# Altium footprint library GVI_Z7_Carrier.PcbLib: 1 footprints
Each footprint in its own frame and in the unit in brackets; x right, y up, seen from the top. Pads: shape width x height; smd on the part's side, far side on the other; paste and mask are expansions set on the pad; w line width, h text height; cw(c..) or ccw(c..) is an arc to the next point about the centre after c.
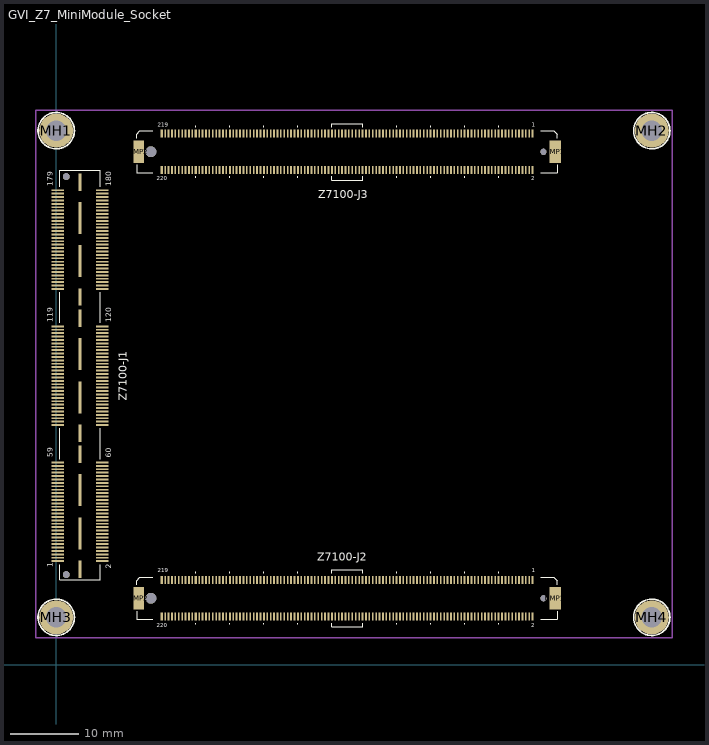
[diagram p0: the footprint, top view; thin cyan lines are the x and y axes]

## GVI_Z7_MiniModule_Socket [mm]
pads (646):
  rect 1.85x0.279 smd: 1(0.22,15.25) 2(6.78,15.25) 3(0.22,15.75) 4(6.78,15.75) 5(0.22,16.25) 6(6.78,16.25) 7(0.22,16.75) 8(6.78,16.75) 9(0.22,17.25) 10(6.78,17.25) 11(0.22,17.75) 12(6.78,17.75) 13(0.22,18.25) 14(6.78,18.25) 15(0.22,18.75) 16(6.78,18.75) 17(0.22,19.25) 18(6.78,19.25) 19(0.22,19.75) 20(6.78,19.75) 21(0.22,20.25) 22(6.78,20.25) 23(0.22,20.75) 24(6.78,20.75) 25(0.22,21.25) 26(6.78,21.25) 27(0.22,21.75) 28(6.78,21.75) 29(0.22,22.25) 30(6.78,22.25) 31(0.22,22.75) 32(6.78,22.75) 33(0.22,23.25) 34(6.78,23.25) 35(0.22,23.75) 36(6.78,23.75) 37(0.22,24.25) 38(6.78,24.25) 39(0.22,24.75) 40(6.78,24.75) 41(0.22,25.25) 42(6.78,25.25) 43(0.22,25.75) 44(6.78,25.75) 45(0.22,26.25) 46(6.78,26.25) 47(0.22,26.75) 48(6.78,26.75) 49(0.22,27.25) 50(6.78,27.25) 51(0.22,27.75) 52(6.78,27.75) 53(0.22,28.25) 54(6.78,28.25) 55(0.22,28.75) 56(6.78,28.75) 57(0.22,29.25) 58(6.78,29.25) 59(0.22,29.75) 60(6.78,29.75) 61(0.22,35.25) 62(6.78,35.25) 63(0.22,35.75) 64(6.78,35.75) 65(0.22,36.25) 66(6.78,36.25) 67(0.22,36.75) 68(6.78,36.75) 69(0.22,37.25) 70(6.78,37.25) 71(0.22,37.75) 72(6.78,37.75) 73(0.22,38.25) 74(6.78,38.25) 75(0.22,38.75) 76(6.78,38.75) 77(0.22,39.25) 78(6.78,39.25) 79(0.22,39.75) 80(6.78,39.75) 81(0.22,40.25) 82(6.78,40.25) 83(0.22,40.75) 84(6.78,40.75) 85(0.22,41.25) 86(6.78,41.25) 87(0.22,41.75) 88(6.78,41.75) 89(0.22,42.25) 90(6.78,42.25) 91(0.22,42.75) 92(6.78,42.75) 93(0.22,43.25) 94(6.78,43.25) 95(0.22,43.75) 96(6.78,43.75) 97(0.22,44.25) 98(6.78,44.25) 99(0.22,44.75) 100(6.78,44.75) 101(0.22,45.25) 102(6.78,45.25) 103(0.22,45.75) 104(6.78,45.75) 105(0.22,46.25) 106(6.78,46.25) 107(0.22,46.75) 108(6.78,46.75) 109(0.22,47.25) 110(6.78,47.25) 111(0.22,47.75) 112(6.78,47.75) 113(0.22,48.25) 114(6.78,48.25) 115(0.22,48.75) 116(6.78,48.75) 117(0.22,49.25) 118(6.78,49.25) 119(0.22,49.75) 120(6.78,49.75) 121(0.22,55.25) 122(6.78,55.25) 123(0.22,55.75) 124(6.78,55.75) 125(0.22,56.25) 126(6.78,56.25) 127(0.22,56.75) 128(6.78,56.75) 129(0.22,57.25) 130(6.78,57.25) 131(0.22,57.75) 132(6.78,57.75) 133(0.22,58.25) 134(6.78,58.25) 135(0.22,58.75) 136(6.78,58.75) 137(0.22,59.25) 138(6.78,59.25) 139(0.22,59.75) 140(6.78,59.75) 141(0.22,60.25) 142(6.78,60.25) 143(0.22,60.75) 144(6.78,60.75) 145(0.22,61.25) 146(6.78,61.25) 147(0.22,61.75) 148(6.78,61.75) 149(0.22,62.25) 150(6.78,62.25) 151(0.22,62.75) 152(6.78,62.75) 153(0.22,63.25) 154(6.78,63.25) 155(0.22,63.75) 156(6.78,63.75) 157(0.22,64.25) 158(6.78,64.25) 159(0.22,64.75) 160(6.78,64.75) 161(0.22,65.25) 162(6.78,65.25) 163(0.22,65.75) 164(6.78,65.75) 165(0.22,66.25) 166(6.78,66.25) 167(0.22,66.75) 168(6.78,66.75) 169(0.22,67.25) 170(6.78,67.25) 171(0.22,67.75) 172(6.78,67.75) 173(0.22,68.25) 174(6.78,68.25) 175(0.22,68.75) 176(6.78,68.75) 177(0.22,69.25) 178(6.78,69.25) 179(0.22,69.75) 180(6.78,69.75)
  rect 0.3x1.2 smd: B1(70,12.5) B2(70,7.1) B21(65,12.5) B22(65,7.1) B41(60,12.5) B42(60,7.1) B61(55,12.5) B62(55,7.1) B81(50,12.5) B82(50,7.1) B101(45,12.5) B102(45,7.1) B119(40.5,12.5) B120(40.5,7.1) B139(35.5,12.5) B140(35.5,7.1) B159(30.5,12.5) B160(30.5,7.1) B179(25.5,12.5) B180(25.5,7.1) B199(20.5,12.5) B200(20.5,7.1) B219(15.5,12.5) B220(15.5,7.1) T1(70,78.1) T2(70,72.7) T21(65,78.1) T22(65,72.7) T41(60,78.1) T42(60,72.7) T61(55,78.1) T62(55,72.7) T81(50,78.1) T82(50,72.7) T101(45,78.1) T102(45,72.7) T119(40.5,78.1) T120(40.5,72.7) T139(35.5,78.1) T140(35.5,72.7) T159(30.5,78.1) T160(30.5,72.7) T179(25.5,78.1) T180(25.5,72.7) T199(20.5,78.1) T200(20.5,72.7) T219(15.5,78.1) T220(15.5,72.7)
  rect 0.25x1.2 smd: B3(69.5,12.5) B4(69.5,7.1) B5(69,12.5) B6(69,7.1) B7(68.5,12.5) B8(68.5,7.1) B9(68,12.5) B10(68,7.1) B11(67.5,12.5) B12(67.5,7.1) B13(67,12.5) B14(67,7.1) B15(66.5,12.5) B16(66.5,7.1) B17(66,12.5) B18(66,7.1) B19(65.5,12.5) B20(65.5,7.1) B23(64.5,12.5) B24(64.5,7.1) B25(64,12.5) B26(64,7.1) B27(63.5,12.5) B28(63.5,7.1) B29(63,12.5) B30(63,7.1) B31(62.5,12.5) B32(62.5,7.1) B33(62,12.5) B34(62,7.1) B35(61.5,12.5) B36(61.5,7.1) B37(61,12.5) B38(61,7.1) B39(60.5,12.5) B40(60.5,7.1) B43(59.5,12.5) B44(59.5,7.1) B45(59,12.5) B46(59,7.1) B47(58.5,12.5) B48(58.5,7.1) B49(58,12.5) B50(58,7.1) B51(57.5,12.5) B52(57.5,7.1) B53(57,12.5) B54(57,7.1) B55(56.5,12.5) B56(56.5,7.1) B57(56,12.5) B58(56,7.1) B59(55.5,12.5) B60(55.5,7.1) B63(54.5,12.5) B64(54.5,7.1) B65(54,12.5) B66(54,7.1) B67(53.5,12.5) B68(53.5,7.1) B69(53,12.5) B70(53,7.1) B71(52.5,12.5) B72(52.5,7.1) B73(52,12.5) B74(52,7.1) B75(51.5,12.5) B76(51.5,7.1) B77(51,12.5) B78(51,7.1) B79(50.5,12.5) B80(50.5,7.1) B83(49.5,12.5) B84(49.5,7.1) B85(49,12.5) B86(49,7.1) B87(48.5,12.5) B88(48.5,7.1) B89(48,12.5) B90(48,7.1) B91(47.5,12.5) B92(47.5,7.1) B93(47,12.5) B94(47,7.1) B95(46.5,12.5) B96(46.5,7.1) B97(46,12.5) B98(46,7.1) B99(45.5,12.5) B100(45.5,7.1) B103(44.5,12.5) B104(44.5,7.1) B105(44,12.5) B106(44,7.1) B107(43.5,12.5) B108(43.5,7.1) B109(43,12.5) B110(43,7.1) B111(42.5,12.5) B112(42.5,7.1) B113(42,12.5) B114(42,7.1) B115(41.5,12.5) B116(41.5,7.1) B117(41,12.5) B118(41,7.1) B121(40,12.5) B122(40,7.1) B123(39.5,12.5) B124(39.5,7.1) B125(39,12.5) B126(39,7.1) B127(38.5,12.5) B128(38.5,7.1) B129(38,12.5) B130(38,7.1) B131(37.5,12.5) B132(37.5,7.1) B133(37,12.5) B134(37,7.1) B135(36.5,12.5) B136(36.5,7.1) B137(36,12.5) B138(36,7.1) B141(35,12.5) B142(35,7.1) B143(34.5,12.5) B144(34.5,7.1) B145(34,12.5) B146(34,7.1) B147(33.5,12.5) B148(33.5,7.1) B149(33,12.5) B150(33,7.1) B151(32.5,12.5) B152(32.5,7.1) B153(32,12.5) B154(32,7.1) B155(31.5,12.5) B156(31.5,7.1) B157(31,12.5) B158(31,7.1) B161(30,12.5) B162(30,7.1) B163(29.5,12.5) B164(29.5,7.1) B165(29,12.5) B166(29,7.1) B167(28.5,12.5) B168(28.5,7.1) B169(28,12.5) B170(28,7.1) B171(27.5,12.5) B172(27.5,7.1) B173(27,12.5) B174(27,7.1) B175(26.5,12.5) B176(26.5,7.1) B177(26,12.5) B178(26,7.1) B181(25,12.5) B182(25,7.1) B183(24.5,12.5) B184(24.5,7.1) B185(24,12.5) B186(24,7.1) B187(23.5,12.5) B188(23.5,7.1) B189(23,12.5) B190(23,7.1) B191(22.5,12.5) B192(22.5,7.1) B193(22,12.5) B194(22,7.1) B195(21.5,12.5) B196(21.5,7.1) B197(21,12.5) B198(21,7.1) B201(20,12.5) B202(20,7.1) B203(19.5,12.5) B204(19.5,7.1) B205(19,12.5) B206(19,7.1) B207(18.5,12.5) B208(18.5,7.1) B209(18,12.5) B210(18,7.1) B211(17.5,12.5) B212(17.5,7.1) B213(17,12.5) B214(17,7.1) B215(16.5,12.5) B216(16.5,7.1) B217(16,12.5) B218(16,7.1) T3(69.5,78.1) T4(69.5,72.7) T5(69,78.1) T6(69,72.7) T7(68.5,78.1) T8(68.5,72.7) T9(68,78.1) T10(68,72.7) T11(67.5,78.1) T12(67.5,72.7) T13(67,78.1) T14(67,72.7) T15(66.5,78.1) T16(66.5,72.7) T17(66,78.1) T18(66,72.7) T19(65.5,78.1) T20(65.5,72.7) T23(64.5,78.1) T24(64.5,72.7) T25(64,78.1) T26(64,72.7) T27(63.5,78.1) T28(63.5,72.7) T29(63,78.1) T30(63,72.7) T31(62.5,78.1) T32(62.5,72.7) T33(62,78.1) T34(62,72.7) T35(61.5,78.1) T36(61.5,72.7) T37(61,78.1) T38(61,72.7) T39(60.5,78.1) T40(60.5,72.7) T43(59.5,78.1) T44(59.5,72.7) T45(59,78.1) T46(59,72.7) T47(58.5,78.1) T48(58.5,72.7) T49(58,78.1) T50(58,72.7) T51(57.5,78.1) T52(57.5,72.7) T53(57,78.1) T54(57,72.7) T55(56.5,78.1) T56(56.5,72.7) T57(56,78.1) T58(56,72.7) T59(55.5,78.1) T60(55.5,72.7) T63(54.5,78.1) T64(54.5,72.7) T65(54,78.1) T66(54,72.7) T67(53.5,78.1) T68(53.5,72.7) T69(53,78.1) T70(53,72.7) T71(52.5,78.1) T72(52.5,72.7) T73(52,78.1) T74(52,72.7) T75(51.5,78.1) T76(51.5,72.7) T77(51,78.1) T78(51,72.7) T79(50.5,78.1) T80(50.5,72.7) T83(49.5,78.1) T84(49.5,72.7) T85(49,78.1) T86(49,72.7) T87(48.5,78.1) T88(48.5,72.7) T89(48,78.1) T90(48,72.7) T91(47.5,78.1) T92(47.5,72.7) T93(47,78.1) T94(47,72.7) T95(46.5,78.1) T96(46.5,72.7) T97(46,78.1) T98(46,72.7) T99(45.5,78.1) T100(45.5,72.7) T103(44.5,78.1) T104(44.5,72.7) T105(44,78.1) T106(44,72.7) T107(43.5,78.1) T108(43.5,72.7) T109(43,78.1) T110(43,72.7) T111(42.5,78.1) T112(42.5,72.7) T113(42,78.1) T114(42,72.7) T115(41.5,78.1) T116(41.5,72.7) T117(41,78.1) T118(41,72.7) T121(40,78.1) T122(40,72.7) T123(39.5,78.1) T124(39.5,72.7) T125(39,78.1) T126(39,72.7) T127(38.5,78.1) T128(38.5,72.7) T129(38,78.1) T130(38,72.7) T131(37.5,78.1) T132(37.5,72.7) T133(37,78.1) T134(37,72.7) T135(36.5,78.1) T136(36.5,72.7) T137(36,78.1) T138(36,72.7) T141(35,78.1) T142(35,72.7) T143(34.5,78.1) T144(34.5,72.7) T145(34,78.1) T146(34,72.7) T147(33.5,78.1) T148(33.5,72.7) T149(33,78.1) T150(33,72.7) T151(32.5,78.1) T152(32.5,72.7) T153(32,78.1) T154(32,72.7) T155(31.5,78.1) T156(31.5,72.7) T157(31,78.1) T158(31,72.7) T161(30,78.1) T162(30,72.7) T163(29.5,78.1) T164(29.5,72.7) T165(29,78.1) T166(29,72.7) T167(28.5,78.1) T168(28.5,72.7) T169(28,78.1) T170(28,72.7) T171(27.5,78.1) T172(27.5,72.7) T173(27,78.1) T174(27,72.7) T175(26.5,78.1) T176(26.5,72.7) T177(26,78.1) T178(26,72.7) T181(25,78.1) T182(25,72.7) T183(24.5,78.1) T184(24.5,72.7) T185(24,78.1) T186(24,72.7) T187(23.5,78.1) T188(23.5,72.7) T189(23,78.1) T190(23,72.7) T191(22.5,78.1) T192(22.5,72.7) T193(22,78.1) T194(22,72.7) T195(21.5,78.1) T196(21.5,72.7) T197(21,78.1) T198(21,72.7) T201(20,78.1) T202(20,72.7) T203(19.5,78.1) T204(19.5,72.7) T205(19,78.1) T206(19,72.7) T207(18.5,78.1) T208(18.5,72.7) T209(18,78.1) T210(18,72.7) T211(17.5,78.1) T212(17.5,72.7) T213(17,78.1) T214(17,72.7) T215(16.5,78.1) T216(16.5,72.7) T217(16,78.1) T218(16,72.7)
  rect 1.65x3.3 smd: BMP1(73.325,9.8) TMP1(73.325,75.4)
  rect 1.55x3.3 smd: BMP2(12.125,9.8) TMP2(12.125,75.4)
  round 0.9 hole 0.9: BR1(71.6,9.8) TR1(71.6,75.4)
  round 1.6 hole 1.6: BR2(13.9,9.8) TR2(13.9,75.4)
  round 1.02 hole 1.02: M1(1.47,13.261) M2(1.47,71.739)
  round 5 hole 3: MH1(0,78.5) MH2(87.5,78.5) MH3(0,7) MH4(87.5,7)
  rect 0.43x2.54 smd: s1(3.5,14.06) s4(3.5,30.94) s5(3.5,34.06) s8(3.5,50.94) s9(3.5,54.06) s12(3.5,70.94)
  rect 0.43x4.7 smd: s2(3.5,19.325) s3(3.5,25.675) s6(3.5,39.328) s7(3.5,45.678) s10(3.5,59.331) s11(3.5,65.681)
Top Overlay:
  circle w0.254: c0,7 r2.667
  circle w0.254: c87.5,7 r2.667
  circle w0.254: c87.5,78.5 r2.667
  circle w0.254: c0,78.5 r2.667
  lines w0.1: 11.8,7.9 11.8,6.7 14.2,6.7 ; 11.8,11.8 11.8,12.4 12.3,12.9 14.2,12.9 ; 11.8,73.5 11.8,72.3 14.2,72.3 ; 11.8,77.4 11.8,78 12.3,78.5 14.2,78.5 ; 20.5,5.95 20.5,6.15 ; 20.5,13.5 20.5,13.7 ; 20.5,71.6 20.5,71.8 ; 20.5,79 20.5,79.2 ; 25.5,5.95 25.5,6.15 ; 25.5,13.5 25.5,13.7 ; 25.5,71.6 25.5,71.8 ; 25.5,79 25.5,79.2 ; 30.5,5.95 30.5,6.15 ; 30.5,13.5 30.5,13.7 ; 30.5,71.6 30.5,71.8 ; 30.5,79 30.5,79.2 ; 35.5,5.95 35.5,6.15 ; 35.5,13.5 35.5,13.7 ; 35.5,71.6 35.5,71.8 ; 35.5,79 35.5,79.2 ; 40.5,6.15 40.5,5.6 45,5.6 45,6.15 ; 40.5,13.5 40.5,14 45,14 45,13.5 ; 40.5,71.8 40.5,71.25 45,71.25 45,71.8 ; 40.5,79 40.5,79.5 45,79.5 45,79 ; 50,5.95 50,6.15 ; 50,13.5 50,13.7 ; 50,71.6 50,71.8 ; 50,79 50,79.2 ; 55,5.95 55,6.15 ; 55,13.5 55,13.7 ; 55,71.6 55,71.8 ; 55,79 55,79.2 ; 60,5.95 60,6.15 ; 60,13.5 60,13.7 ; 60,71.6 60,71.8 ; 60,79 60,79.2 ; 65,5.95 65,6.15 ; 65,13.5 65,13.7 ; 65,71.6 65,71.8 ; 65,79 65,79.2 ; 71.2,6.7 73.6,6.7 73.6,7.9 ; 71.2,12.9 73.1,12.9 73.6,12.4 73.6,11.8 ; 71.2,72.3 73.6,72.3 73.6,73.5 ; 71.2,78.5 73.1,78.5 73.6,78 73.6,77.4
  lines w0.153: 0.515,14.75 0.515,12.51 6.485,12.51 6.485,14.75 ; 0.515,30.25 0.515,34.75 ; 0.515,50.25 0.515,54.75 ; 0.515,70.25 0.515,72.65 6.485,72.65 6.485,70.25 ; 6.485,30.25 6.485,34.75 ; 6.485,50.25 6.485,54.75
  text "Z7100-J3" at 38.5,68.55 h1.2
  text "Z7100-J2" at 38.35,15.3 h1.2
  text "Z7100-J1" at 10.35,38.85 h1.2
  text "2" at 69.8,5.55 h0.6
  text "220" at 14.8,5.55 h0.6
  text "1" at 69.9,13.6 h0.6
  text "219" at 14.9,13.6 h0.6
  text "59" at -0.5,30.55 h0.8
  text "60" at 8.1,30.45 h0.8
  text "120" at 8.1,50.35 h0.8
  text "180" at 8.1,70.35 h0.8
  text "179" at -0.5,70.35 h0.8
  text "2" at 8.1,14.15 h0.8
  text "1" at -0.5,14.35 h0.8
  text "119" at -0.5,50.35 h0.8
  text "220" at 14.8,71.2 h0.6
  text "219" at 14.9,79.1 h0.6
  text "2" at 69.8,71.2 h0.6
  text "1" at 69.9,79.1 h0.6
Bottom Overlay:
  circle w0.254: c0,7 r2.667
  circle w0.254: c87.5,7 r2.667
  circle w0.254: c87.5,78.5 r2.667
  circle w0.254: c0,78.5 r2.667
Mechanical 15:
  lines w0.254: -3,4 -3,81.5 90.5,81.5 90.5,4 -3,4
  text "QTH_J1" at 2.05,73.8 h1
3D body "c-3-1827253-6-o-3d.stp": height 4.45, standoff -0.6, extent 11.8,6.7 73.6,12.9
3D body "QTH-090-01-X-D-A.step": height 4.23, standoff -0.78, extent -0.056,12.546 7.056,72.554
3D body "c-3-1827253-6-o-3d.stp": height 4.45, standoff -0.6, extent 11.8,72.3 73.6,78.5